# Altium footprint library Connector-Header.PcbLib: 166 footprints (part 5 of 11)
Each footprint in its own frame and in the unit in brackets; x right, y up, seen from the top. Pads: shape width x height; smd on the part's side, far side on the other; paste and mask are expansions set on the pad; w line width, h text height; cw(c..) or ccw(c..) is an arc to the next point about the centre after c.
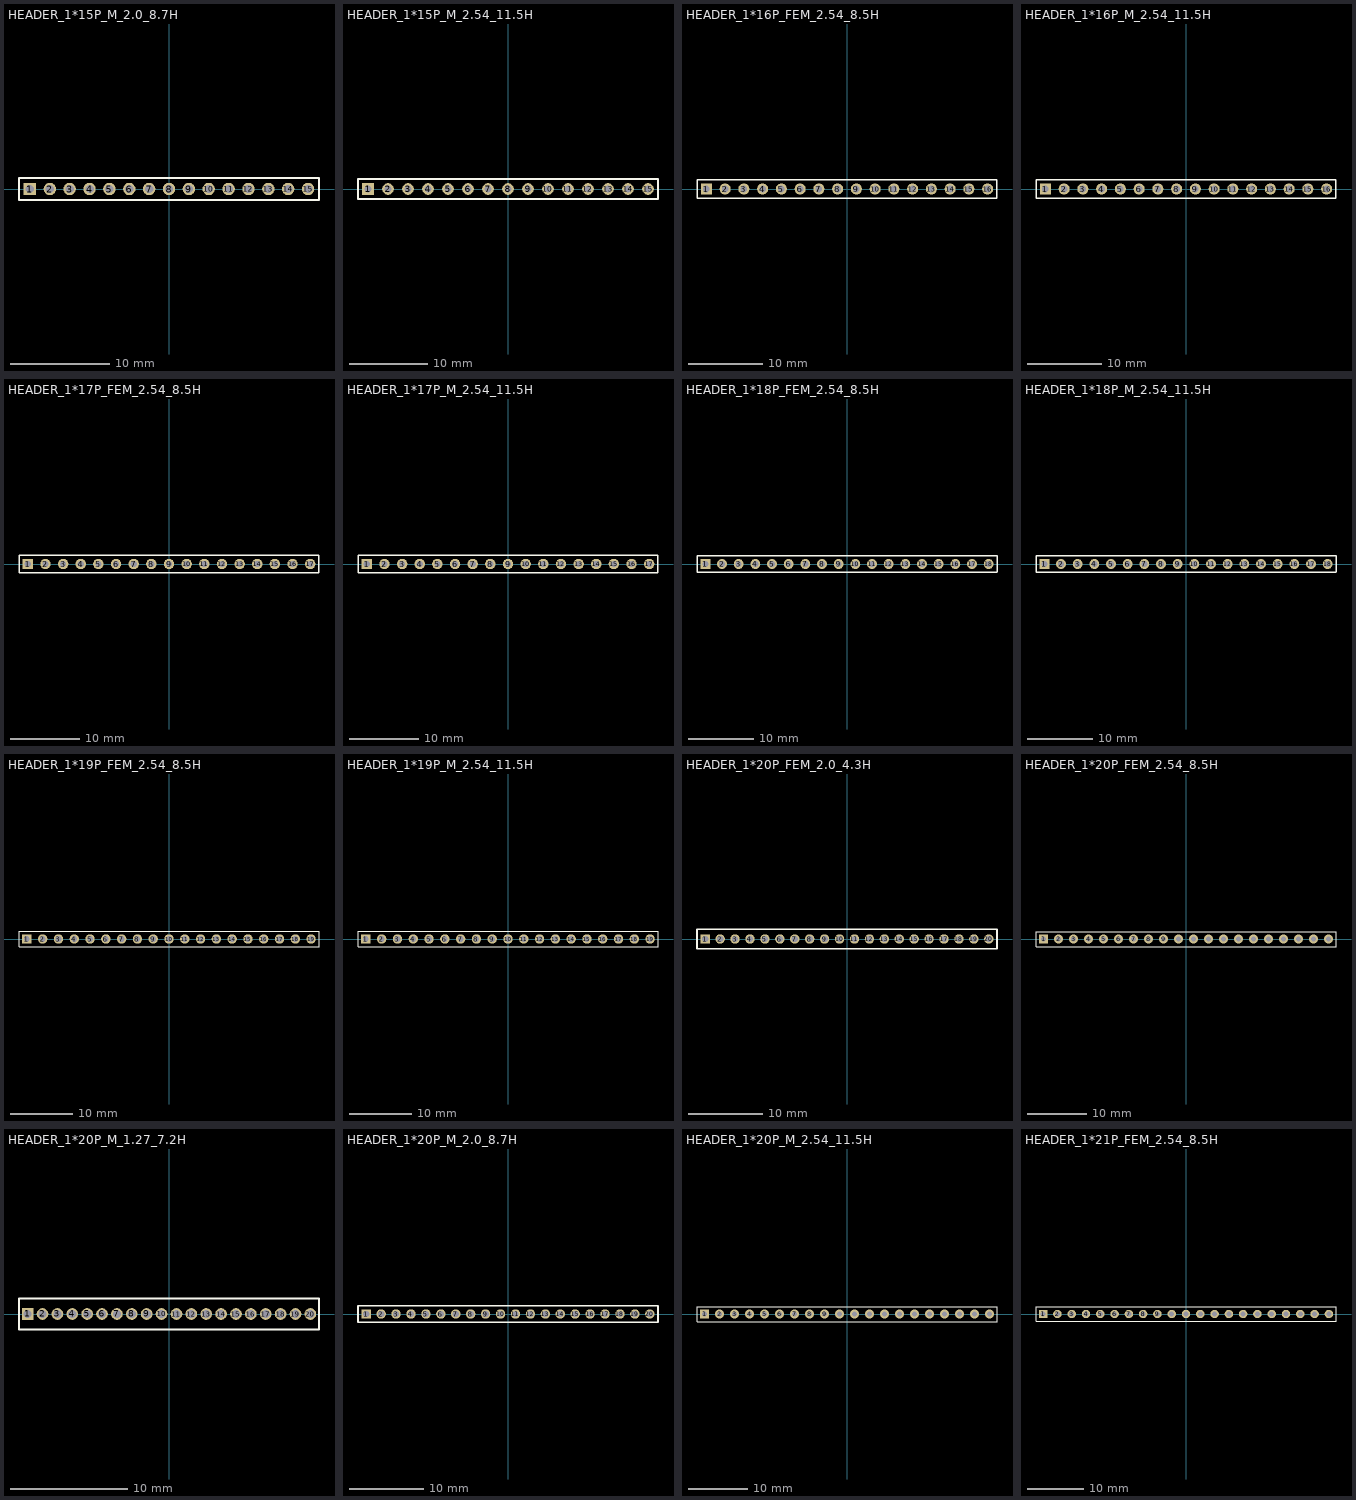
[diagram p4: the footprints below, top view; thin cyan lines are the x and y axes]

## HEADER_1*15P_M_2.0_8.7H [mm]
pads (15):
  rect 1.25x1.25 hole 0.85: 1(-14,0)
  round 1.25 hole 0.85: 2(-12,0) 3(-10,0) 4(-8,0) 5(-6,0) 6(-4,0) 7(-2,0) 8(0,0) 9(2,0) 10(4,0) 11(6,0) 12(8,0) 13(10,0) 14(12,0) 15(14,0)
Top Overlay:
  lines w0.203: -15.1,-1.1 15.1,-1.1 15.1,1.1 -15.1,1.1 -15.1,-1.1

## HEADER_1*15P_M_2.54_11.5H [mm] "Connector; Header; 15 Position"
pads (15):
  rect 1.5x1.5 hole 0.9: 1(-17.78,0)
  round 1.5 hole 0.9: 2(-15.24,0) 3(-12.7,0) 4(-10.16,0) 5(-7.62,0) 6(-5.08,0) 7(-2.54,0) 8(0,0) 9(2.54,0) 10(5.08,0) 11(7.62,0) 12(10.16,0) 13(12.7,0) 14(15.24,0) 15(17.78,0)
Top Overlay:
  lines w0.2: -19.05,-1.27 -19.05,1.27 -17.145,1.27 19.05,1.27 19.05,-1.27 -19.05,-1.27
3D body "PinHeader_1x15_P2.54mm_Vertical.step": height 8.54, standoff -3, extent -19.05,-1.27 19.05,1.27

## HEADER_1*16P_FEM_2.54_8.5H [mm] "Connector; Header; 16 Position"
pads (16):
  rect 1.5x1.5 hole 0.9: 1(-19.05,0)
  round 1.5 hole 0.9: 2(-16.51,0) 3(-13.97,0) 4(-11.43,0) 5(-8.89,0) 6(-6.35,0) 7(-3.81,0) 8(-1.27,0) 9(1.27,0) 10(3.81,0) 11(6.35,0) 12(8.89,0) 13(11.43,0) 14(13.97,0) 15(16.51,0) 16(19.05,0)
Top Overlay:
  lines w0.2: -20.32,-1.27 20.32,-1.27 20.32,1.27 -18.415,1.27 -20.32,1.27 -20.32,-1.27
3D body "PinSocket_1x16_P2.54mm_Vertical.step": height 7, standoff -3.1, extent -20.32,-1.27 20.32,1.27

## HEADER_1*16P_M_2.54_11.5H [mm] "Connector; Header; 16 Position"
pads (16):
  rect 1.5x1.5 hole 0.9: 1(-19.05,0)
  round 1.5 hole 0.9: 2(-16.51,0) 3(-13.97,0) 4(-11.43,0) 5(-8.89,0) 6(-6.35,0) 7(-3.81,0) 8(-1.27,0) 9(1.27,0) 10(3.81,0) 11(6.35,0) 12(8.89,0) 13(11.43,0) 14(13.97,0) 15(16.51,0) 16(19.05,0)
Top Overlay:
  lines w0.2: -20.32,-1.27 20.32,-1.27 20.32,1.27 -18.415,1.27 -20.32,1.27 -20.32,-1.27
3D body "PinHeader_1x16_P2.54mm_Vertical.step": height 8.54, standoff -3, extent -20.32,-1.27 20.32,1.27

## HEADER_1*17P_FEM_2.54_8.5H [mm] "Connector; Header; 17 Position"
pads (17):
  rect 1.5x1.5 hole 0.9: 1(-20.32,0)
  round 1.5 hole 0.9: 2(-17.78,0) 3(-15.24,0) 4(-12.7,0) 5(-10.16,0) 6(-7.62,0) 7(-5.08,0) 8(-2.54,0) 9(0,0) 10(2.54,0) 11(5.08,0) 12(7.62,0) 13(10.16,0) 14(12.7,0) 15(15.24,0) 16(17.78,0) 17(20.32,0)
Top Overlay:
  lines w0.2: -21.59,-1.27 -21.59,1.27 -19.685,1.27 21.59,1.27 21.59,-1.27 -21.59,-1.27
3D body "PinSocket_1x17_P2.54mm_Vertical.step": height 7, standoff -3.1, extent -21.59,-1.27 21.59,1.27

## HEADER_1*17P_M_2.54_11.5H [mm] "Connector; Header; 17 Position"
pads (17):
  rect 1.5x1.5 hole 0.9: 1(-20.32,0)
  round 1.5 hole 0.9: 2(-17.78,0) 3(-15.24,0) 4(-12.7,0) 5(-10.16,0) 6(-7.62,0) 7(-5.08,0) 8(-2.54,0) 9(0,0) 10(2.54,0) 11(5.08,0) 12(7.62,0) 13(10.16,0) 14(12.7,0) 15(15.24,0) 16(17.78,0) 17(20.32,0)
Top Overlay:
  lines w0.2: -21.59,-1.27 21.59,-1.27 21.59,1.27 -19.685,1.27 -21.59,1.27 -21.59,-1.27
3D body "PinHeader_1x17_P2.54mm_Vertical.step": height 8.54, standoff -3, extent -21.59,-1.27 21.59,1.27

## HEADER_1*18P_FEM_2.54_8.5H [mm] "Connector; Header; 18 Position"
pads (18):
  rect 1.5x1.5 hole 0.9: 1(-21.59,0)
  round 1.5 hole 0.9: 2(-19.05,0) 3(-16.51,0) 4(-13.97,0) 5(-11.43,0) 6(-8.89,0) 7(-6.35,0) 8(-3.81,0) 9(-1.27,0) 10(1.27,0) 11(3.81,0) 12(6.35,0) 13(8.89,0) 14(11.43,0) 15(13.97,0) 16(16.51,0) 17(19.05,0) 18(21.59,0)
Top Overlay:
  lines w0.2: 22.835,-1.27 -22.86,-1.27 -22.86,1.27 -20.955,1.27 22.86,1.27 22.86,-1.27
3D body "PinSocket_1x18_P2.54mm_Vertical.step": height 7, standoff -3.1, extent -22.86,-1.27 22.86,1.27

## HEADER_1*18P_M_2.54_11.5H [mm] "Connector; Header; 18 Position"
pads (18):
  rect 1.5x1.5 hole 0.9: 1(-21.59,0)
  round 1.5 hole 0.9: 2(-19.05,0) 3(-16.51,0) 4(-13.97,0) 5(-11.43,0) 6(-8.89,0) 7(-6.35,0) 8(-3.81,0) 9(-1.27,0) 10(1.27,0) 11(3.81,0) 12(6.35,0) 13(8.89,0) 14(11.43,0) 15(13.97,0) 16(16.51,0) 17(19.05,0) 18(21.59,0)
Top Overlay:
  lines w0.2: 22.835,-1.27 -22.86,-1.27 -22.86,1.27 -20.955,1.27 22.86,1.27 22.86,-1.27
3D body "PinHeader_1x18_P2.54mm_Vertical.step": height 8.54, standoff -3, extent -22.86,-1.27 22.86,1.27

## HEADER_1*19P_FEM_2.54_8.5H [mm] "Connector; Header; 19 Position"
pads (19):
  rect 1.5x1.5 hole 0.9: 1(-22.86,0)
  round 1.5 hole 0.9: 2(-20.32,0) 3(-17.78,0) 4(-15.24,0) 5(-12.7,0) 6(-10.16,0) 7(-7.62,0) 8(-5.08,0) 9(-2.54,0) 10(0,0) 11(2.54,0) 12(5.08,0) 13(7.62,0) 14(10.16,0) 15(12.7,0) 16(15.24,0) 17(17.78,0) 18(20.32,0) 19(22.86,0)
Top Overlay:
  lines w0.2: 24.105,1.27 -22.225,1.27 -24.13,1.27 -24.13,-1.27 24.13,-1.27 24.13,1.27
3D body "PinSocket_1x19_P2.54mm_Vertical.step": height 7, standoff -3.1, extent -24.13,-1.27 24.13,1.27

## HEADER_1*19P_M_2.54_11.5H [mm] "Connector; Header; 19 Position"
pads (19):
  rect 1.5x1.5 hole 0.9: 1(-22.86,0)
  round 1.5 hole 0.9: 2(-20.32,0) 3(-17.78,0) 4(-15.24,0) 5(-12.7,0) 6(-10.16,0) 7(-7.62,0) 8(-5.08,0) 9(-2.54,0) 10(0,0) 11(2.54,0) 12(5.08,0) 13(7.62,0) 14(10.16,0) 15(12.7,0) 16(15.24,0) 17(17.78,0) 18(20.32,0) 19(22.86,0)
Top Overlay:
  lines w0.2: 24.105,1.27 -22.225,1.27 -24.13,1.27 -24.13,-1.27 24.13,-1.27 24.13,1.27
3D body "PinHeader_1x19_P2.54mm_Vertical.step": height 8.54, standoff -3, extent -24.13,-1.27 24.13,1.27

## HEADER_1*20P_FEM_2.0_4.3H [mm]
pads (20):
  rect 1.25x1.25 hole 0.85: 1(-19,0)
  round 1.25 hole 0.85: 2(-17,0) 3(-15,0) 4(-13,0) 5(-11,0) 6(-9,0) 7(-7,0) 8(-5,0) 9(-3,0) 10(-1,0) 11(1,0) 12(3,0) 13(5,0) 14(7,0) 15(9,0) 16(11,0) 17(13,0) 18(15,0) 19(17,0) 20(19,0)
Top Overlay:
  lines w0.203: -20.1,-1.3 20.1,-1.3 20.1,1.3 -20.1,1.3 -20.1,-1.3

## HEADER_1*20P_FEM_2.54_8.5H [mm] "Connector; Header; 20 Position"
pads (20):
  rect 1.5x1.5 hole 0.9: 1(-24.13,0)
  round 1.5 hole 0.9: 2(-21.59,0) 3(-19.05,0) 4(-16.51,0) 5(-13.97,0) 6(-11.43,0) 7(-8.89,0) 8(-6.35,0) 9(-3.81,0) 10(-1.27,0) 11(1.27,0) 12(3.81,0) 13(6.35,0) 14(8.89,0) 15(11.43,0) 16(13.97,0) 17(16.51,0) 18(19.05,0) 19(21.59,0) 20(24.13,0)
Top Overlay:
  lines w0.2: -25.4,-1.27 25.4,-1.27 25.4,1.27 -23.495,1.27 -25.4,1.27 -25.4,-1.27
3D body "PinSocket_1x20_P2.54mm_Vertical.step": height 7, standoff -3.1, extent -25.4,-1.27 25.4,1.27

## HEADER_1*20P_M_1.27_7.2H [mm]
pads (20):
  rect 1x1 hole 0.7: 1(-12.065,0)
  round 1 hole 0.7: 2(-10.795,0) 3(-9.525,0) 4(-8.255,0) 5(-6.985,0) 6(-5.715,0) 7(-4.445,0) 8(-3.175,0) 9(-1.905,0) 10(-0.635,0) 11(0.635,0) 12(1.905,0) 13(3.175,0) 14(4.445,0) 15(5.715,0) 16(6.985,0) 17(8.255,0) 18(9.525,0) 19(10.795,0) 20(12.065,0)
Top Overlay:
  lines w0.203: -12.802,-1.321 -12.802,1.321 12.802,1.321 12.802,-1.321 -12.802,-1.321

## HEADER_1*20P_M_2.0_8.7H [mm]
pads (20):
  rect 1.25x1.25 hole 0.85: 1(-19,0)
  round 1.25 hole 0.85: 2(-17,0) 3(-15,0) 4(-13,0) 5(-11,0) 6(-9,0) 7(-7,0) 8(-5,0) 9(-3,0) 10(-1,0) 11(1,0) 12(3,0) 13(5,0) 14(7,0) 15(9,0) 16(11,0) 17(13,0) 18(15,0) 19(17,0) 20(19,0)
Top Overlay:
  lines w0.203: -20.1,-1.1 20.1,-1.1 20.1,1.1 -20.1,1.1 -20.1,-1.1

## HEADER_1*20P_M_2.54_11.5H [mm] "Connector; Header; 20 Position"
pads (20):
  rect 1.5x1.5 hole 0.9: 1(-24.13,0)
  round 1.5 hole 0.9: 2(-21.59,0) 3(-19.05,0) 4(-16.51,0) 5(-13.97,0) 6(-11.43,0) 7(-8.89,0) 8(-6.35,0) 9(-3.81,0) 10(-1.27,0) 11(1.27,0) 12(3.81,0) 13(6.35,0) 14(8.89,0) 15(11.43,0) 16(13.97,0) 17(16.51,0) 18(19.05,0) 19(21.59,0) 20(24.13,0)
Top Overlay:
  lines w0.2: -25.4,-1.27 -25.4,1.27 -23.495,1.27 25.4,1.27 25.4,-1.27 -25.4,-1.27
3D body "PinHeader_1x20_P2.54mm_Vertical.step": height 8.54, standoff -3, extent -25.4,-1.27 25.4,1.27

## HEADER_1*21P_FEM_2.54_8.5H [mm] "Connector; Header; 21 Position"
pads (21):
  rect 1.5x1.5 hole 0.9: 1(-25.4,0)
  round 1.5 hole 0.9: 2(-22.86,0) 3(-20.32,0) 4(-17.78,0) 5(-15.24,0) 6(-12.7,0) 7(-10.16,0) 8(-7.62,0) 9(-5.08,0) 10(-2.54,0) 11(0,0) 12(2.54,0) 13(5.08,0) 14(7.62,0) 15(10.16,0) 16(12.7,0) 17(15.24,0) 18(17.78,0) 19(20.32,0) 20(22.86,0) 21(25.4,0)
Top Overlay:
  lines w0.2: -26.67,-1.27 26.67,-1.27 26.67,1.27 -24.765,1.27 -26.67,1.27 -26.67,-1.27
3D body "PinSocket_1x21_P2.54mm_Vertical.step": height 7, standoff -3.1, extent -26.67,-1.27 26.67,1.27